# Altium footprint library PCBLIB.PcbLib: 557 footprints (part 3 of 36)
Each footprint in its own frame and in the unit in brackets; x right, y up, seen from the top. Pads: shape width x height; smd on the part's side, far side on the other; paste and mask are expansions set on the pad; w line width, h text height; cw(c..) or ccw(c..) is an arc to the next point about the centre after c.
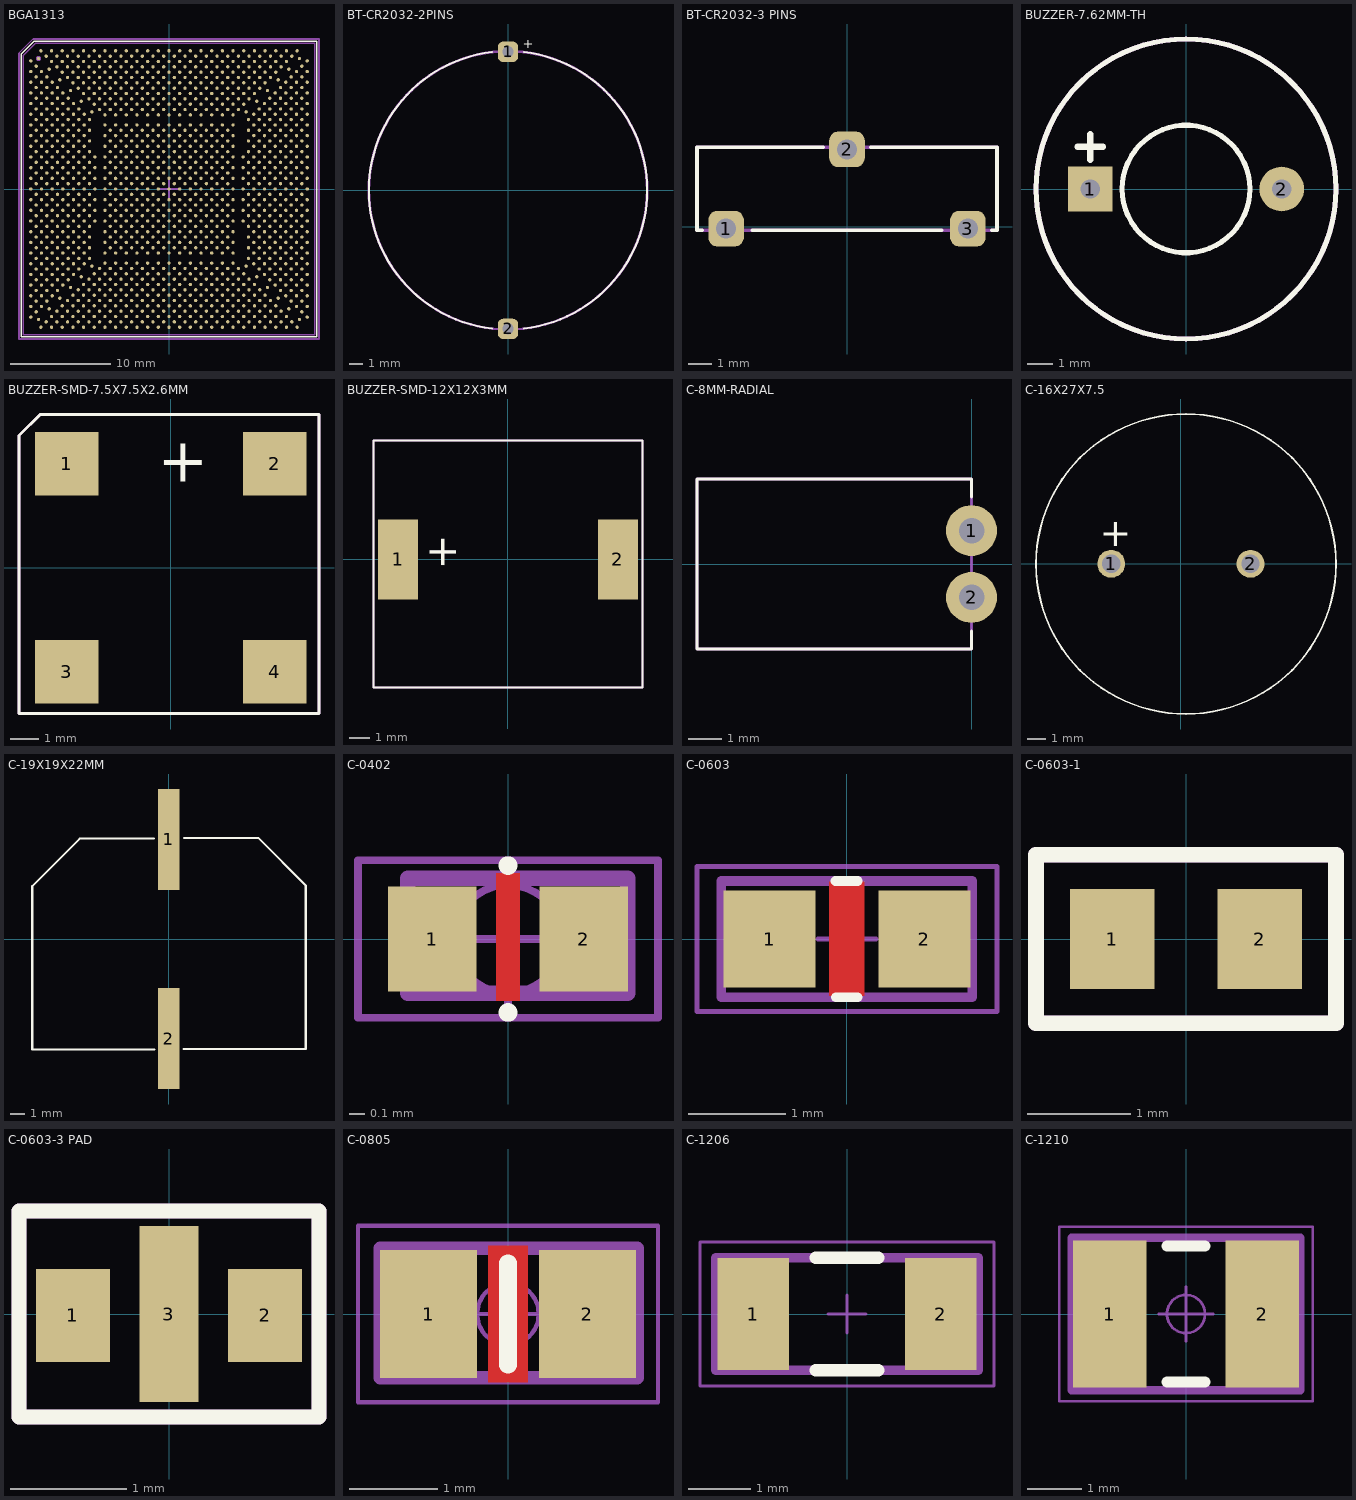
[diagram p2: the footprints below, top view; thin cyan lines are the x and y axes]

## BGA1313 [mil] "0.75 mm pitch, 29 mm x 29 mm x 2.37 mm"
pads (1313):
  round 13 smd: A3(-501.1,540.47) A5(-459.34,540.47) A7(-417.58,540.47) A9(-375.82,540.47) A11(-334.07,540.47) A13(-292.31,540.47) A15(-250.55,540.47) A17(-208.79,540.47) A19(-167.03,540.47) A21(-125.28,540.47) A23(-83.52,540.47) A25(-41.76,540.47) A27(0,540.47) A29(41.76,540.47) A31(83.52,540.47) A33(125.28,540.47) A35(167.03,540.47) A37(208.79,540.47) A39(250.55,540.47) A41(292.31,540.47) A43(334.07,540.47) A45(375.82,540.47) A47(417.58,540.47) A49(459.34,540.47) A51(501.1,540.47) AA1(-540.47,125.28) AA3(-498.71,125.28) AA5(-456.95,125.28) AA7(-415.19,125.28) AA9(-373.44,125.28) AA11(-331.68,125.28) AA13(-289.92,125.28) AA15(-250.55,125.28) AA17(-208.79,125.28) AA19(-167.03,125.28) AA21(-125.28,125.28) AA23(-83.52,125.28) AA25(-41.76,125.28) AA27(0,125.28) AA29(41.76,125.28) AA31(83.52,125.28) AA33(125.28,125.28) AA35(167.03,125.28) AA37(208.79,125.28) AA39(250.55,125.28) AA41(289.92,125.28) AA43(331.68,125.28) AA45(373.44,125.28) AA47(415.19,125.28) AA49(456.95,125.28) AA51(498.71,125.28) AA53(540.47,125.28) AB2(-519.59,104.39) AB4(-477.83,104.39) AB6(-436.07,104.39) AB8(-394.31,104.39) AB10(-352.56,104.39) AB12(-310.8,104.39) AB16(-229.67,104.39) AB18(-187.91,104.39) AB20(-146.15,104.39) AB22(-104.39,104.39) AB24(-62.64,104.39) AB26(-20.88,104.39) AB28(20.88,104.39) AB30(62.64,104.39) AB32(104.39,104.39) AB34(146.15,104.39) AB36(187.91,104.39) AB38(229.67,104.39) AB42(310.8,104.39) AB44(352.56,104.39) AB46(394.31,104.39) AB48(436.07,104.39) AB50(477.83,104.39) AB52(519.59,104.39) AC1(-540.47,83.52) AC3(-498.71,83.52) AC5(-456.95,83.52) AC7(-415.19,83.52) AC9(-373.44,83.52) AC11(-331.68,83.52) AC13(-289.92,83.52) AC15(-250.55,83.52) AC17(-208.79,83.52) AC19(-167.03,83.52) AC21(-125.28,83.52) AC23(-83.52,83.52) AC25(-41.76,83.52) AC27(0,83.52) AC29(41.76,83.52) AC31(83.52,83.52) AC33(125.28,83.52) AC35(167.03,83.52) AC37(208.79,83.52) AC39(250.55,83.52) AC41(289.92,83.52) AC43(331.68,83.52) AC45(373.44,83.52) AC47(415.19,83.52) AC49(456.95,83.52) AC51(498.71,83.52) AC53(540.47,83.52) AD2(-519.59,62.64) AD4(-477.83,62.64) AD6(-436.07,62.64) AD8(-394.31,62.64) AD10(-352.56,62.64) AD12(-310.8,62.64) AD16(-229.67,62.64) AD18(-187.91,62.64) AD20(-146.15,62.64) AD22(-104.39,62.64) AD24(-62.64,62.64) AD26(-20.88,62.64) AD28(20.88,62.64) AD30(62.64,62.64) AD32(104.39,62.64) AD34(146.15,62.64) AD36(187.91,62.64) AD38(229.67,62.64) AD42(310.8,62.64) AD44(352.56,62.64) AD46(394.31,62.64) AD48(436.07,62.64) AD50(477.83,62.64) AD52(519.59,62.64) AE1(-540.47,41.76) AE3(-498.71,41.76) AE5(-456.95,41.76) AE7(-415.19,41.76) AE9(-373.44,41.76) AE11(-331.68,41.76) AE13(-289.92,41.76) AE15(-250.55,41.76) AE17(-208.79,41.76) AE19(-167.03,41.76) AE21(-125.28,41.76) AE23(-83.52,41.76) AE25(-41.76,41.76) AE27(0,41.76) AE29(41.76,41.76) AE31(83.52,41.76) AE33(125.28,41.76) AE35(167.03,41.76) AE37(208.79,41.76) AE39(250.55,41.76) AE41(289.92,41.76) AE43(331.68,41.76) AE45(373.44,41.76) AE47(415.19,41.76) AE49(456.95,41.76) AE51(498.71,41.76) AE53(540.47,41.76) AF2(-519.59,20.88) AF4(-477.83,20.88) AF6(-436.07,20.88) AF8(-394.31,20.88) AF10(-352.56,20.88) AF12(-310.8,20.88) AF16(-229.67,20.88) AF18(-187.91,20.88) AF20(-146.15,20.88) AF22(-104.39,20.88) AF24(-62.64,20.88) AF26(-20.88,20.88) AF28(20.88,20.88) AF30(62.64,20.88) AF32(104.39,20.88) AF34(146.15,20.88) AF36(187.91,20.88) AF38(229.67,20.88) AF42(310.8,20.88) AF44(352.56,20.88) AF46(394.31,20.88) AF48(436.07,20.88) AF50(477.83,20.88) AF52(519.59,20.88) AG1(-540.47,0) AG3(-498.71,0) AG5(-456.95,0) AG7(-415.19,0) AG9(-373.44,0) AG11(-331.68,0) AG13(-289.92,0) AG15(-250.55,0) AG17(-208.79,0) AG19(-167.03,0) AG21(-125.28,0) AG23(-83.52,0) AG25(-41.76,0) AG27(0,0) AG29(41.76,0) AG31(83.52,0) AG33(125.28,0) AG35(167.03,0) AG37(208.79,0) AG39(250.55,0) AG41(289.92,0) AG43(331.68,0) AG45(373.44,0) AG47(415.19,0) AG49(456.95,0) AG51(498.71,0) AG53(540.47,0) AH2(-519.59,-20.88) AH4(-477.83,-20.88) AH6(-436.07,-20.88) AH8(-394.31,-20.88) AH10(-352.56,-20.88) AH12(-310.8,-20.88) AH16(-229.67,-20.88) AH18(-187.91,-20.88) AH20(-146.15,-20.88) AH22(-104.39,-20.88) AH24(-62.64,-20.88) AH26(-20.88,-20.88) AH28(20.88,-20.88) AH30(62.64,-20.88) AH32(104.39,-20.88) AH34(146.15,-20.88) AH36(187.91,-20.88) AH38(229.67,-20.88) AH42(310.8,-20.88) AH44(352.56,-20.88) AH46(394.31,-20.88) AH48(436.07,-20.88) AH50(477.83,-20.88) AH52(519.59,-20.88) AJ1(-540.47,-41.76) AJ3(-498.71,-41.76) AJ5(-456.95,-41.76) AJ7(-415.19,-41.76) AJ9(-373.44,-41.76) AJ11(-331.68,-41.76) AJ13(-289.92,-41.76) AJ15(-250.55,-41.76) AJ17(-208.79,-41.76) AJ19(-167.03,-41.76) AJ21(-125.28,-41.76) AJ23(-83.52,-41.76) AJ25(-41.76,-41.76) AJ27(0,-41.76) AJ29(41.76,-41.76) AJ31(83.52,-41.76) AJ33(125.28,-41.76) AJ35(167.03,-41.76) AJ37(208.79,-41.76) AJ39(250.55,-41.76) AJ41(289.92,-41.76) AJ43(331.68,-41.76) AJ45(373.44,-41.76) AJ47(415.19,-41.76) AJ49(456.95,-41.76) AJ51(498.71,-41.76) AJ53(540.47,-41.76) AK2(-519.59,-62.64) AK4(-477.83,-62.64) AK6(-436.07,-62.64) AK8(-394.31,-62.64) AK10(-352.56,-62.64) AK12(-310.8,-62.64) AK16(-229.67,-62.64) AK18(-187.91,-62.64) AK20(-146.15,-62.64) AK22(-104.39,-62.64) AK24(-62.64,-62.64) AK26(-20.88,-62.64) AK28(20.88,-62.64) AK30(62.64,-62.64) AK32(104.39,-62.64) AK34(146.15,-62.64) AK36(187.91,-62.64) AK38(229.67,-62.64) AK42(310.8,-62.64) AK44(352.56,-62.64) AK46(394.31,-62.64) AK48(436.07,-62.64) AK50(477.83,-62.64) AK52(519.59,-62.64) AL1(-540.47,-83.52) AL3(-498.71,-83.52) AL5(-456.95,-83.52) AL7(-415.19,-83.52) AL9(-373.44,-83.52) AL11(-331.68,-83.52) AL13(-289.92,-83.52) AL15(-250.55,-83.52) AL17(-208.79,-83.52) AL19(-167.03,-83.52) AL21(-125.28,-83.52) AL23(-83.52,-83.52) AL25(-41.76,-83.52) AL27(0,-83.52) AL29(41.76,-83.52) AL31(83.52,-83.52) AL33(125.28,-83.52) AL35(167.03,-83.52) AL37(208.79,-83.52) AL39(250.55,-83.52) AL41(289.92,-83.52) AL43(331.68,-83.52) AL45(373.44,-83.52) AL47(415.19,-83.52) AL49(456.95,-83.52) AL51(498.71,-83.52) AL53(540.47,-83.52) AM2(-519.59,-104.39) AM4(-477.83,-104.39) AM6(-436.07,-104.39) AM8(-394.31,-104.39) AM10(-352.56,-104.39) AM12(-310.8,-104.39) AM16(-229.67,-104.39) AM18(-187.91,-104.39) AM20(-146.15,-104.39) AM22(-104.39,-104.39) AM24(-62.64,-104.39) AM26(-20.88,-104.39) AM28(20.88,-104.39) AM30(62.64,-104.39) AM32(104.39,-104.39) AM34(146.15,-104.39) AM36(187.91,-104.39) AM38(229.67,-104.39) AM42(310.8,-104.39) AM44(352.56,-104.39) AM46(394.31,-104.39) AM48(436.07,-104.39) AM50(477.83,-104.39) AM52(519.59,-104.39) AN1(-540.47,-125.28) AN3(-498.71,-125.28) AN5(-456.95,-125.28) AN7(-415.19,-125.28) AN9(-373.44,-125.28) AN11(-331.68,-125.28) AN13(-289.92,-125.28) AN15(-250.55,-125.28) AN17(-208.79,-125.28) AN19(-167.03,-125.28) AN21(-125.28,-125.28) AN23(-83.52,-125.28) AN25(-41.76,-125.28) AN27(0,-125.28) AN29(41.76,-125.28) AN31(83.52,-125.28) AN33(125.28,-125.28) AN35(167.03,-125.28) AN37(208.79,-125.28) AN39(250.55,-125.28) AN41(289.92,-125.28) AN43(331.68,-125.28) AN45(373.44,-125.28) AN47(415.19,-125.28) AN49(456.95,-125.28) AN51(498.71,-125.28) AN53(540.47,-125.28) AP2(-519.59,-146.15) AP4(-477.83,-146.15) AP6(-436.07,-146.15) AP8(-394.31,-146.15) AP10(-352.56,-146.15) AP12(-310.8,-146.15) AP16(-229.67,-146.15) AP18(-187.91,-146.15) AP20(-146.15,-146.15) AP22(-104.39,-146.15) AP24(-62.64,-146.15) AP26(-20.88,-146.15) AP28(20.88,-146.15) AP30(62.64,-146.15) AP32(104.39,-146.15) AP34(146.15,-146.15) AP36(187.91,-146.15) AP38(229.67,-146.15) AP42(310.8,-146.15) AP44(352.56,-146.15) AP46(394.31,-146.15) AP48(436.07,-146.15) AP50(477.83,-146.15) AP52(519.59,-146.15) AR1(-540.47,-167.03) AR3(-498.71,-167.03) AR5(-456.95,-167.03) AR7(-415.19,-167.03) AR9(-373.44,-167.03) AR11(-331.68,-167.03) AR15(-250.55,-167.03) AR17(-208.79,-167.03) AR19(-167.03,-167.03) AR21(-125.28,-167.03) AR23(-83.52,-167.03) AR25(-41.76,-167.03) AR27(0,-167.03) AR29(41.76,-167.03) AR31(83.52,-167.03) AR33(125.28,-167.03) AR35(167.03,-167.03) AR37(208.79,-167.03) AR39(250.55,-167.03) AR43(331.68,-167.03) AR45(373.44,-167.03) AR47(415.19,-167.03) AR49(456.95,-167.03) AR51(498.71,-167.03) AR53(540.47,-167.03) AT2(-519.59,-187.91) AT4(-477.83,-187.91) AT6(-436.07,-187.91) AT8(-394.31,-187.91) AT10(-352.56,-187.91) AT12(-310.8,-187.91) AT16(-229.67,-187.91) AT18(-187.91,-187.91) AT20(-146.15,-187.91) AT22(-104.39,-187.91) AT24(-62.64,-187.91) AT26(-20.88,-187.91) AT28(20.88,-187.91) AT30(62.64,-187.91) AT32(104.39,-187.91) AT34(146.15,-187.91) AT36(187.91,-187.91) AT38(229.67,-187.91) AT42(310.8,-187.91) AT44(352.56,-187.91) AT46(394.31,-187.91) AT48(436.07,-187.91) AT50(477.83,-187.91) AT52(519.59,-187.91) AU1(-540.47,-208.79) AU3(-498.71,-208.79) AU5(-456.95,-208.79) AU7(-415.19,-208.79) AU9(-373.44,-208.79) AU11(-331.68,-208.79) AU15(-250.55,-208.79) AU17(-208.79,-208.79) AU19(-167.03,-208.79) AU21(-125.28,-208.79) AU23(-83.52,-208.79) AU25(-41.76,-208.79) AU27(0,-208.79) AU29(41.76,-208.79) AU31(83.52,-208.79) AU33(125.28,-208.79) AU35(167.03,-208.79) AU37(208.79,-208.79) AU39(250.55,-208.79) AU43(331.68,-208.79) AU45(373.44,-208.79) AU47(415.19,-208.79) AU49(456.95,-208.79) AU51(498.71,-208.79) AU53(540.47,-208.79) AV2(-519.59,-229.67) AV4(-477.83,-229.67) AV6(-436.07,-229.67) AV8(-394.31,-229.67) AV10(-352.56,-229.67) AV12(-310.8,-229.67) AV16(-229.67,-229.67) AV18(-187.91,-229.67) AV20(-146.15,-229.67) AV22(-104.39,-229.67) AV24(-62.64,-229.67) AV26(-20.88,-229.67) AV28(20.88,-229.67) AV30(62.64,-229.67) AV32(104.39,-229.67) AV34(146.15,-229.67) AV36(187.91,-229.67) AV38(229.67,-229.67) AV42(310.8,-229.67) AV44(352.56,-229.67) AV46(394.31,-229.67) AV48(436.07,-229.67) AV50(477.83,-229.67) AV52(519.59,-229.67) AW1(-540.47,-250.55) AW3(-498.71,-250.55) AW5(-456.95,-250.55) AW7(-415.19,-250.55) AW9(-373.44,-250.55) AW11(-331.68,-250.55) AW15(-250.55,-250.55) AW17(-208.79,-250.55) AW19(-167.03,-250.55) AW21(-125.28,-250.55) AW23(-83.52,-250.55) AW25(-41.76,-250.55) AW27(0,-250.55) AW29(41.76,-250.55) AW31(83.52,-250.55) AW33(125.28,-250.55) AW35(167.03,-250.55) AW37(208.79,-250.55) AW39(250.55,-250.55) AW43(331.68,-250.55) AW45(373.44,-250.55) AW47(415.19,-250.55) AW49(456.95,-250.55) AW51(498.71,-250.55) AW53(540.47,-250.55) AY2(-519.59,-271.43) AY4(-477.83,-271.43) AY6(-436.07,-271.43) AY8(-394.31,-271.43) AY10(-352.56,-271.43) AY12(-310.8,-271.43) AY42(310.8,-271.43) AY44(352.56,-271.43) AY46(394.31,-271.43) AY48(436.07,-271.43) AY50(477.83,-271.43) AY52(519.59,-271.43) B4(-480.22,519.59) B6(-438.46,519.59) B8(-396.7,519.59) B10(-354.94,519.59) B12(-313.19,519.59) B14(-271.43,519.59) B16(-229.67,519.59) B18(-187.91,519.59) B20(-146.15,519.59) B22(-104.39,519.59) B24(-62.64,519.59) B26(-20.88,519.59) B28(20.88,519.59) B30(62.64,519.59) B32(104.39,519.59) B34(146.15,519.59) B36(187.91,519.59) B38(229.67,519.59) B40(271.43,519.59) B42(313.19,519.59) B44(354.94,519.59) B46(396.7,519.59) B48(438.46,519.59) B50(480.22,519.59) BA1(-540.47,-292.31) BA3(-498.71,-292.31) BA5(-456.95,-292.31) BA7(-415.19,-292.31) BA9(-373.44,-292.31) BA11(-331.68,-292.31) BA13(-301.55,-301.55) BA15(-250.55,-289.92) BA17(-208.79,-289.92) BA19(-167.03,-289.92) BA21(-125.28,-289.92) BA23(-83.52,-289.92) BA25(-41.76,-289.92) BA27(0,-289.92) BA29(41.76,-289.92) BA31(83.52,-289.92) BA33(125.28,-289.92) BA35(167.03,-289.92) BA37(208.79,-289.92) BA39(250.55,-289.92) BA41(301.55,-301.55) BA43(331.68,-292.31) BA45(373.44,-292.31) BA47(415.19,-292.31) BA49(456.95,-292.31) BA51(498.71,-292.31) BA53(540.47,-292.31) BB2(-519.59,-313.19) BB4(-477.83,-313.19) BB6(-436.07,-313.19) BB8(-394.31,-313.19) BB10(-352.56,-313.19) BB14(-271.43,-310.8) BB16(-229.67,-310.8) BB18(-187.91,-310.8) BB20(-146.15,-310.8) BB22(-104.39,-310.8) BB24(-62.64,-310.8) BB26(-20.88,-310.8) BB28(20.88,-310.8) BB30(62.64,-310.8) BB32(104.39,-310.8) BB34(146.15,-310.8) BB36(187.91,-310.8) BB38(229.67,-310.8) BB40(271.43,-310.8) BB44(352.56,-313.19) BB46(394.31,-313.19) BB48(436.07,-313.19) BB50(477.83,-313.19) BB52(519.59,-313.19) BC1(-540.47,-334.07) BC3(-498.71,-334.07) BC5(-456.95,-334.07) BC7(-415.19,-334.07) BC9(-373.44,-334.07) BC11(-343.31,-343.31) BC13(-292.31,-331.68) BC15(-250.55,-331.68) BC17(-208.79,-331.68) BC19(-167.03,-331.68) BC21(-125.28,-331.68) BC23(-83.52,-331.68) BC25(-41.76,-331.68) BC27(0,-331.68) BC29(41.76,-331.68) BC31(83.52,-331.68) BC33(125.28,-331.68) BC35(167.03,-331.68) BC37(208.79,-331.68) BC39(250.55,-331.68) BC41(292.31,-331.68) BC43(343.31,-343.31) BC45(373.44,-334.07) BC47(415.19,-334.07) BC49(456.95,-334.07) BC51(498.71,-334.07) BC53(540.47,-334.07) BD2(-519.59,-354.94) BD4(-477.83,-354.94) BD6(-436.07,-354.94) BD8(-394.31,-354.94) BD12(-313.19,-352.56) BD14(-271.43,-352.56) BD16(-229.67,-352.56) BD18(-187.91,-352.56) BD20(-146.15,-352.56) BD22(-104.39,-352.56) BD24(-62.64,-352.56) BD26(-20.88,-352.56) BD28(20.88,-352.56) BD30(62.64,-352.56) BD32(104.39,-352.56) BD34(146.15,-352.56) BD36(187.91,-352.56) BD38(229.67,-352.56) BD40(271.43,-352.56) BD42(313.19,-352.56) BD46(394.31,-354.94) BD48(436.07,-354.94) BD50(477.83,-354.94) BD52(519.59,-354.94) BE1(-540.47,-375.82) BE3(-498.71,-375.82) BE5(-456.95,-375.82) BE7(-415.19,-375.82) BE9(-385.07,-385.07) BE11(-334.07,-373.44) BE13(-292.31,-373.44) BE15(-250.55,-373.44) BE17(-208.79,-373.44) BE19(-167.03,-373.44) BE21(-125.28,-373.44) BE23(-83.52,-373.44) BE25(-41.76,-373.44) BE27(0,-373.44) BE29(41.76,-373.44) BE31(83.52,-373.44) BE33(125.28,-373.44) BE35(167.03,-373.44) BE37(208.79,-373.44) BE39(250.55,-373.44) BE41(292.31,-373.44) BE43(334.07,-373.44) BE45(385.07,-385.07) BE47(415.19,-375.82) BE49(456.95,-375.82) BE51(498.71,-375.82) BE53(540.47,-375.82) BF2(-519.59,-396.7) BF4(-477.83,-396.7) BF6(-436.07,-396.7) BF10(-354.94,-394.31) BF12(-313.19,-394.31) BF14(-271.43,-394.31) BF16(-229.67,-394.31) BF18(-187.91,-394.31) BF20(-146.15,-394.31) BF22(-104.39,-394.31) BF24(-62.64,-394.31) BF26(-20.88,-394.31) BF28(20.88,-394.31) BF30(62.64,-394.31) BF32(104.39,-394.31) BF34(146.15,-394.31) BF36(187.91,-394.31) BF38(229.67,-394.31) BF40(271.43,-394.31) BF42(313.19,-394.31) BF44(354.94,-394.31) BF48(436.07,-396.7) BF50(477.83,-396.7) BF52(519.59,-396.7) BG1(-540.47,-417.58) BG3(-498.71,-417.58) BG5(-456.95,-417.58) BG7(-426.83,-426.83) BG9(-375.82,-415.19) BG11(-334.07,-415.19) BG13(-292.31,-415.19) BG15(-250.55,-415.19) BG17(-208.79,-415.19) BG19(-167.03,-415.19) BG21(-125.28,-415.19) BG23(-83.52,-415.19) BG25(-41.76,-415.19) BG27(0,-415.19) BG29(41.76,-415.19) BG31(83.52,-415.19) BG33(125.28,-415.19) BG35(167.03,-415.19) BG37(208.79,-415.19) BG39(250.55,-415.19) BG41(292.31,-415.19) BG43(334.07,-415.19) BG45(375.82,-415.19) BG47(426.83,-426.83) BG49(456.95,-417.58) BG51(498.71,-417.58) BG53(540.47,-417.58) BH2(-519.59,-438.46) BH4(-477.83,-438.46) BH8(-396.7,-436.07) BH10(-354.94,-436.07) BH12(-313.19,-436.07) BH14(-271.43,-436.07) BH16(-229.67,-436.07) BH18(-187.91,-436.07) BH20(-146.15,-436.07) BH22(-104.39,-436.07) BH24(-62.64,-436.07) BH26(-20.88,-436.07) BH28(20.88,-436.07) BH30(62.64,-436.07) BH32(104.39,-436.07) BH34(146.15,-436.07) BH36(187.91,-436.07) BH38(229.67,-436.07) BH40(271.43,-436.07) BH42(313.19,-436.07) BH44(354.94,-436.07) BH46(396.7,-436.07) BH50(477.83,-438.46) BH52(519.59,-438.46) BJ1(-540.47,-459.34) BJ3(-498.71,-459.34) BJ5(-468.59,-468.59) BJ7(-417.58,-456.95) BJ9(-375.82,-456.95) BJ11(-334.07,-456.95) BJ13(-292.31,-456.95) BJ15(-250.55,-456.95) BJ17(-208.79,-456.95) BJ19(-167.03,-456.95) BJ21(-125.28,-456.95) BJ23(-83.52,-456.95) BJ25(-41.76,-456.95) BJ27(0,-456.95) BJ29(41.76,-456.95) BJ31(83.52,-456.95) BJ33(125.28,-456.95) BJ35(167.03,-456.95) BJ37(208.79,-456.95) BJ39(250.55,-456.95) BJ41(292.31,-456.95) BJ43(334.07,-456.95) BJ45(375.82,-456.95) BJ47(417.58,-456.95) BJ49(468.59,-468.59) BJ51(498.71,-459.34) BJ53(540.47,-459.34) BK2(-519.59,-480.22) BK6(-438.46,-477.83) BK8(-396.7,-477.83) BK10(-354.94,-477.83) BK12(-313.19,-477.83) BK14(-271.43,-477.83) BK16(-229.67,-477.83) BK18(-187.91,-477.83) BK20(-146.15,-477.83) BK22(-104.39,-477.83) BK24(-62.64,-477.83) BK26(-20.88,-477.83) BK28(20.88,-477.83) BK30(62.64,-477.83) BK32(104.39,-477.83) BK34(146.15,-477.83) BK36(187.91,-477.83) BK38(229.67,-477.83) BK40(271.43,-477.83) BK42(313.19,-477.83) BK44(354.94,-477.83) BK46(396.7,-477.83) BK48(438.46,-477.83) BK52(519.59,-480.22) BL1(-540.47,-501.1) BL3(-510.34,-510.34) BL5(-459.34,-498.71) BL7(-417.58,-498.71) BL9(-375.82,-498.71) BL11(-334.07,-498.71) BL13(-292.31,-498.71) BL15(-250.55,-498.71) BL17(-208.79,-498.71) BL19(-167.03,-498.71) BL21(-125.28,-498.71) BL23(-83.52,-498.71) BL25(-41.76,-498.71) BL27(0,-498.71) BL29(41.76,-498.71) BL31(83.52,-498.71) BL33(125.28,-498.71) BL35(167.03,-498.71) BL37(208.79,-498.71) BL39(250.55,-498.71) BL41(292.31,-498.71) BL43(334.07,-498.71) BL45(375.82,-498.71) BL47(417.58,-498.71) BL49(459.34,-498.71) BL51(510.34,-510.34) BL53(540.47,-501.1) BM4(-480.22,-519.59) BM6(-438.46,-519.59) BM8(-396.7,-519.59) BM10(-354.94,-519.59) BM12(-313.19,-519.59) BM14(-271.43,-519.59) BM16(-229.67,-519.59) BM18(-187.91,-519.59) BM20(-146.15,-519.59) BM22(-104.39,-519.59) BM24(-62.64,-519.59) BM26(-20.88,-519.59) BM28(20.88,-519.59) BM30(62.64,-519.59) BM32(104.39,-519.59) BM34(146.15,-519.59) BM36(187.91,-519.59) BM38(229.67,-519.59) BM40(271.43,-519.59) BM42(313.19,-519.59) BM44(354.94,-519.59) BM46(396.7,-519.59) BM48(438.46,-519.59) BM50(480.22,-519.59) BN3(-501.1,-540.47) BN5(-459.34,-540.47) BN7(-417.58,-540.47) BN9(-375.82,-540.47) BN11(-334.07,-540.47) BN13(-292.31,-540.47) BN15(-250.55,-540.47) BN17(-208.79,-540.47) BN19(-167.03,-540.47) BN21(-125.28,-540.47) BN23(-83.52,-540.47) BN25(-41.76,-540.47) BN27(0,-540.47) BN29(41.76,-540.47) BN31(83.52,-540.47) BN33(125.28,-540.47) BN35(167.03,-540.47) BN37(208.79,-540.47) BN39(250.55,-540.47) BN41(292.31,-540.47) BN43(334.07,-540.47) BN45(375.82,-540.47) BN47(417.58,-540.47) BN49(459.34,-540.47) BN51(501.1,-540.47) C1(-540.47,501.1) C3(-510.34,510.34) C5(-459.34,498.71) C7(-417.58,498.71) C9(-375.82,498.71) C11(-334.07,498.71) C13(-292.31,498.71) C15(-250.55,498.71) C17(-208.79,498.71) C19(-167.03,498.71) C21(-125.28,498.71) C23(-83.52,498.71) C25(-41.76,498.71) C27(0,498.71) C29(41.76,498.71) C31(83.52,498.71) C33(125.28,498.71) C35(167.03,498.71) C37(208.79,498.71) C39(250.55,498.71) C41(292.31,498.71) C43(334.07,498.71) C45(375.82,498.71) C47(417.58,498.71) C49(459.34,498.71) C51(510.34,510.34) C53(540.47,501.1) D2(-519.59,480.22) D6(-438.46,477.83) D8(-396.7,477.83) D10(-354.94,477.83) D12(-313.19,477.83) D14(-271.43,477.83) D16(-229.67,477.83) D18(-187.91,477.83) D20(-146.15,477.83) D22(-104.39,477.83) D24(-62.64,477.83) D26(-20.88,477.83) D28(20.88,477.83) D30(62.64,477.83) D32(104.39,477.83) D34(146.15,477.83) D36(187.91,477.83) D38(229.67,477.83) D40(271.43,477.83) D42(313.19,477.83) D44(354.94,477.83) D46(396.7,477.83) D48(438.46,477.83) D52(519.59,480.22) E1(-540.47,459.34) E3(-498.71,459.34) E5(-468.59,468.59) E7(-417.58,456.95) E9(-375.82,456.95) E11(-334.07,456.95) E13(-292.31,456.95) E15(-250.55,456.95) E17(-208.79,456.95) E19(-167.03,456.95) E21(-125.28,456.95) E23(-83.52,456.95) E25(-41.76,456.95) E27(0,456.95) E29(41.76,456.95) E31(83.52,456.95) E33(125.28,456.95) E35(167.03,456.95) E37(208.79,456.95) E39(250.55,456.95) E41(292.31,456.95) E43(334.07,456.95) E45(375.82,456.95) E47(417.58,456.95) E49(468.59,468.59) E51(498.71,459.34) E53(540.47,459.34) F2(-519.59,438.46) F4(-477.83,438.46) F8(-396.7,436.07) F10(-354.94,436.07) F12(-313.19,436.07) F14(-271.43,436.07) F16(-229.67,436.07) F18(-187.91,436.07) F20(-146.15,436.07) F22(-104.39,436.07) F24(-62.64,436.07) F26(-20.88,436.07) F28(20.88,436.07) F30(62.64,436.07) F32(104.39,436.07) F34(146.15,436.07) F36(187.91,436.07) F38(229.67,436.07) F40(271.43,436.07) F42(313.19,436.07) F44(354.94,436.07) F46(396.7,436.07) F50(477.83,438.46) F52(519.59,438.46) G1(-540.47,417.58) G3(-498.71,417.58) G5(-456.95,417.58) G7(-426.83,426.83) G9(-375.82,415.19) G11(-334.07,415.19) G13(-292.31,415.19) G15(-250.55,415.19) G17(-208.79,415.19) G19(-167.03,415.19) G21(-125.28,415.19) G23(-83.52,415.19) G25(-41.76,415.19) G27(0,415.19) G29(41.76,415.19) G31(83.52,415.19) G33(125.28,415.19) G35(167.03,415.19) G37(208.79,415.19) G39(250.55,415.19) G41(292.31,415.19) G43(334.07,415.19) G45(375.82,415.19) G47(426.83,426.83) G49(456.95,417.58) G51(498.71,417.58) G53(540.47,417.58) H2(-519.59,396.7) H4(-477.83,396.7) H6(-436.07,396.7) H10(-354.94,394.31) H12(-313.19,394.31) H14(-271.43,394.31) H16(-229.67,394.31) H18(-187.91,394.31) H20(-146.15,394.31) H22(-104.39,394.31) H24(-62.64,394.31) H26(-20.88,394.31) H28(20.88,394.31) H30(62.64,394.31) H32(104.39,394.31) H34(146.15,394.31) H36(187.91,394.31) H38(229.67,394.31) H40(271.43,394.31) H42(313.19,394.31) H44(354.94,394.31) H48(436.07,396.7) H50(477.83,396.7) H52(519.59,396.7) J1(-540.47,375.82) J3(-498.71,375.82) J5(-456.95,375.82) J7(-415.19,375.82) J9(-385.07,385.07) J11(-334.07,373.44) J13(-292.31,373.44) J15(-250.55,373.44) J17(-208.79,373.44) J19(-167.03,373.44) J21(-125.28,373.44) J23(-83.52,373.44) J25(-41.76,373.44) J27(0,373.44) J29(41.76,373.44) J31(83.52,373.44) J33(125.28,373.44) J35(167.03,373.44) J37(208.79,373.44) J39(250.55,373.44) J41(292.31,373.44) J43(334.07,373.44) J45(385.07,385.07) J47(415.19,375.82) J49(456.95,375.82) J51(498.71,375.82) J53(540.47,375.82) K2(-519.59,354.94) K4(-477.83,354.94) K6(-436.07,354.94) K8(-394.31,354.94) K12(-313.19,352.56) K14(-271.43,352.56) K16(-229.67,352.56) K18(-187.91,352.56) K20(-146.15,352.56) K22(-104.39,352.56) K24(-62.64,352.56) K26(-20.88,352.56) K28(20.88,352.56) K30(62.64,352.56) K32(104.39,352.56) K34(146.15,352.56) K36(187.91,352.56) K38(229.67,352.56) K40(271.43,352.56) K42(313.19,352.56) K46(394.31,354.94) K48(436.07,354.94) K50(477.83,354.94) K52(519.59,354.94) L1(-540.47,334.07) L3(-498.71,334.07) L5(-456.95,334.07) L7(-415.19,334.07) L9(-373.44,334.07) L11(-343.31,343.31) L13(-292.31,331.68) L15(-250.55,331.68) L17(-208.79,331.68) L19(-167.03,331.68) L21(-125.28,331.68) L23(-83.52,331.68) L25(-41.76,331.68) L27(0,331.68) L29(41.76,331.68) L31(83.52,331.68) L33(125.28,331.68) L35(167.03,331.68) L37(208.79,331.68) L39(250.55,331.68) L41(292.31,331.68) L43(343.31,343.31) L45(373.44,334.07) L47(415.19,334.07) L49(456.95,334.07) L51(498.71,334.07) L53(540.47,334.07) M2(-519.59,313.19) M4(-477.83,313.19) M6(-436.07,313.19) M8(-394.31,313.19) M10(-352.56,313.19) M14(-271.43,310.8) M16(-229.67,310.8) M18(-187.91,310.8) M20(-146.15,310.8) M22(-104.39,310.8) M24(-62.64,310.8) M26(-20.88,310.8) M28(20.88,310.8) M30(62.64,310.8) M32(104.39,310.8) M34(146.15,310.8) M36(187.91,310.8) M38(229.67,310.8) M40(271.43,310.8) M44(352.56,313.19) M46(394.31,313.19) M48(436.07,313.19) M50(477.83,313.19) M52(519.59,313.19) N1(-540.47,292.31) N3(-498.71,292.31) N5(-456.95,292.31) N7(-415.19,292.31) N9(-373.44,292.31) N11(-331.68,292.31) N13(-301.55,301.55) N15(-250.55,289.92) N17(-208.79,289.92) N19(-167.03,289.92) N21(-125.28,289.92) N23(-83.52,289.92) N25(-41.76,289.92) N27(0,289.92) N29(41.76,289.92) N31(83.52,289.92) N33(125.28,289.92) N35(167.03,289.92) N37(208.79,289.92) N39(250.55,289.92) N41(301.55,301.55) N43(331.68,292.31) N45(373.44,292.31) N47(415.19,292.31) N49(456.95,292.31) N51(498.71,292.31) N53(540.47,292.31) P2(-519.59,271.43) P4(-477.83,271.43) P6(-436.07,271.43) P8(-394.31,271.43) P10(-352.56,271.43) P12(-310.8,271.43) P42(310.8,271.43) P44(352.56,271.43) P46(394.31,271.43) P48(436.07,271.43) P50(477.83,271.43) P52(519.59,271.43) R1(-540.47,250.55) R3(-498.71,250.55) R5(-456.95,250.55) R7(-415.19,250.55) R9(-373.44,250.55) R11(-331.68,250.55) R15(-250.55,250.55) R17(-208.79,250.55) R19(-167.03,250.55) R21(-125.28,250.55) R23(-83.52,250.55) R25(-41.76,250.55) R27(0,250.55) R29(41.76,250.55) R31(83.52,250.55) R33(125.28,250.55) R35(167.03,250.55) R37(208.79,250.55) R39(250.55,250.55) R43(331.68,250.55) R45(373.44,250.55) R47(415.19,250.55) R49(456.95,250.55) R51(498.71,250.55) R53(540.47,250.55) T2(-519.59,229.67) T4(-477.83,229.67) T6(-436.07,229.67) T8(-394.31,229.67) T10(-352.56,229.67) T12(-310.8,229.67) T16(-229.67,229.67) T18(-187.91,229.67) T20(-146.15,229.67) T22(-104.39,229.67) T24(-62.64,229.67) T26(-20.88,229.67) T28(20.88,229.67) T30(62.64,229.67) T32(104.39,229.67) T34(146.15,229.67) T36(187.91,229.67) T38(229.67,229.67) T42(310.8,229.67) T44(352.56,229.67) T46(394.31,229.67) T48(436.07,229.67) T50(477.83,229.67) T52(519.59,229.67) U1(-540.47,208.79) U3(-498.71,208.79) U5(-456.95,208.79) U7(-415.19,208.79) U9(-373.44,208.79) U11(-331.68,208.79) U15(-250.55,208.79) U17(-208.79,208.79) U19(-167.03,208.79) U21(-125.28,208.79) U23(-83.52,208.79) U25(-41.76,208.79) U27(0,208.79) U29(41.76,208.79) U31(83.52,208.79) U33(125.28,208.79) U35(167.03,208.79) U37(208.79,208.79) U39(250.55,208.79) U43(331.68,208.79) U45(373.44,208.79) U47(415.19,208.79) U49(456.95,208.79) U51(498.71,208.79) U53(540.47,208.79) V2(-519.59,187.91) V4(-477.83,187.91) V6(-436.07,187.91) V8(-394.31,187.91) V10(-352.56,187.91) V12(-310.8,187.91) V16(-229.67,187.91) V18(-187.91,187.91) V20(-146.15,187.91) V22(-104.39,187.91) V24(-62.64,187.91) V26(-20.88,187.91) V28(20.88,187.91) V30(62.64,187.91) V32(104.39,187.91) V34(146.15,187.91) V36(187.91,187.91) V38(229.67,187.91) V42(310.8,187.91) V44(352.56,187.91) V46(394.31,187.91) V48(436.07,187.91) V50(477.83,187.91) V52(519.59,187.91) W1(-540.47,167.03) W3(-498.71,167.03) W5(-456.95,167.03) W7(-415.19,167.03) W9(-373.44,167.03) W11(-331.68,167.03) W15(-250.55,167.03) W17(-208.79,167.03) W19(-167.03,167.03) W21(-125.28,167.03) W23(-83.52,167.03) W25(-41.76,167.03) W27(0,167.03) W29(41.76,167.03) W31(83.52,167.03) W33(125.28,167.03) W35(167.03,167.03) W37(208.79,167.03) W39(250.55,167.03) W43(331.68,167.03) W45(373.44,167.03) W47(415.19,167.03) W49(456.95,167.03) W51(498.71,167.03) W53(540.47,167.03) Y2(-519.59,146.15) Y4(-477.83,146.15) Y6(-436.07,146.15) Y8(-394.31,146.15) Y10(-352.56,146.15) Y12(-310.8,146.15) Y16(-229.67,146.15) Y18(-187.91,146.15) Y20(-146.15,146.15) Y22(-104.39,146.15) Y24(-62.64,146.15) Y26(-20.88,146.15) Y28(20.88,146.15) Y30(62.64,146.15) Y32(104.39,146.15) Y34(146.15,146.15) Y36(187.91,146.15) Y38(229.67,146.15) Y42(310.8,146.15) Y44(352.56,146.15) Y46(394.31,146.15) Y48(436.07,146.15) Y50(477.83,146.15) Y52(519.59,146.15)
Top Overlay:
  lines w6: -577.87,-577.87 577.87,-577.87 577.87,577.87 -527.87,577.87 -577.87,527.87 -577.87,-577.87
Mechanical 15:
  lines w6: -586.61,-586.61 -586.61,531.5 -531.5,586.61 586.61,586.61 586.61,-586.61 -586.61,-586.61
  lines w7.87: -43.31,0 0,0 ; 0,-43.31 0,0 ; 0,43.31 0,0 ; 43.31,0 0,0
ASM Top:
  circle w11.81: c-510.34,510.34 r4.72
  lines w6: -570.87,-570.87 -570.87,520.87 -520.87,570.87 570.87,570.87 570.87,-570.87 -570.87,-570.87
  text ".designator" at 0.05,10.1 h59.06

## BT-CR2032-2PINS [mm]
pads (2):
  rrect50% 1.5x1.5 hole 0.85: 1(0,10.25) 2(0,-10.25)
Top Overlay:
  lines w0.15: -1.197,-10.226 cw(c0,0) -1.197,10.226 ; 1.197,-10.226 ccw(c0,0) 1.197,10.226
  text "+" at 1.1,10.5 h0.7
ASM Top:
  circle w0.2: c0,0 r10.296
  text ".designator" at -0.6,-0.1 h0.8
3D body "CircuitWorks-BATT CR2032.step": height 3.21, standoff 0.01, extent -10,-10 10,10

## BT-CR2032-3 PINS [mm]
pads (3):
  rrect50% 1.5x1.5 hole 0.85: 1(-5.1,-0.075) 2(0,3.27) 3(5.1,-0.075)
Top Overlay:
  lines w0.15: -6.1,-0.15 -6.325,-0.15 -6.325,3.35 -1,3.35 ; -4,-0.15 4,-0.15 ; 1,3.35 6.325,3.35 6.325,-0.15 6.1,-0.15
ASM Top:
  lines w0.15: -6.325,-0.15 6.325,-0.15 6.325,3.35 -6.325,3.35 -6.325,-0.15
  text ".designator" at -1.91,1.19 h0.8
3D body "User Library-CR2032-PEN3 - Li-MnO2 Battery EEMB.step": height 21.04, standoff -3.99, extent -10.025,-0.15 10.025,3.35

## BUZZER-7.62MM-TH [mil]
pads (2):
  rect 70x70 hole 30 mask+0: 1(-150,0)
  round 70 hole 30 mask+0: 2(150,0)
Top Overlay:
  circle w8: c0,0 r235
  circle w8: c0,0 r100
  lines w10: -170,66 -130,66 ; -150,46 -150,86
ASM Top:
  circle w8: c0,0 r235
  text ".designator" at -169,-76 h31.5
3D body "cem-1205c.stp": height 374.52, standoff -176.67, extent -235.22,-235.21 237.23,237.23

## BUZZER-SMD-7.5X7.5X2.6MM [mm]
pads (4):
  rect 2.2x2.2 smd: 1(-3.6,3.6) 2(3.6,3.6) 3(-3.6,-3.6) 4(3.6,-3.6)
Top Overlay:
  lines w0.102: -5.258,-5.055 -5.258,4.572 -4.521,5.309 5.131,5.309 5.131,-5.055 -4.216,-5.055 -5.258,-5.055
  text "+" at -0.457,2.972 h1.52
ASM Top:
  lines w0.102: -5.258,-5.055 -5.258,4.572 -4.521,5.309 5.131,5.309 5.131,-5.055 -4.216,-5.055 -5.258,-5.055
  text ".designator" at -3.556,-0.203 h0.8
3D body "ST-025BL-1.step": height 2.53, standoff 0.01, extent -3.75,-3.725 3.75,3.775

## BUZZER-SMD-12X12X3MM [mm]
pads (2):
  rect 2x4 smd: 1(-5.5,0) 2(5.5,0)
Top Overlay:
  lines w0.102: -6.731,-6.401 -6.731,5.944 6.731,5.944 6.731,-6.401 -6.731,-6.401
  text "+" at -2.591,-0.508 h1.52
ASM Top:
  lines w0.102: -6.731,-6.401 6.731,-6.401 6.731,5.944 -6.731,5.944 -6.731,-6.401
  text ".designator" at -1.346,-0.152 h0.8
3D body "CUI_CMT-1203-SMT.step": height 3.06, standoff 0.01, extent -6.203,-6.209 5.797,5.791

## C-8MM-RADIAL [mil]
pads (2):
  round 60 hole 30: 1(0,39.37) 2(0,-39.37)
Top Overlay:
  lines w4: 0,-79 0,-100 -323,-100 -323,100 0,100 0,79
ASM Top:
  lines w4: -323,-100 0,-100 0,100 -323,100 -323,-100
  text ".designator" at -299,-20 h31.5

## C-16X27X7.5 [mil]
pads (2):
  round 60 hole 39.37: 1(-150,0) 2(150,0)
Top Overlay:
  circle w4: c11,-0.45 r322.95
  text "+" at -175,38 h60
3D body "ESH158M035AM7AA.step": height 1102.67, standoff -748.14, extent -313.8,-325.25 335.8,325

## C-19X19X22MM [mm]
pads (2):
  rect 1.5x7 smd: 1(0,6.9) 2(0,-6.9)
Top Overlay:
  lines w0.152: -1.041,6.96 -6.172,6.96 -9.474,3.658 -9.474,-7.671 -0.991,-7.671 ; 1.016,-7.62 9.5,-7.62 9.5,3.708 6.198,7.01 1.067,7.01

## C-0402 [mm]
pads (2):
  rect 0.57x0.68 smd: 1(-0.49,0) 2(0.49,0)
Top Layer:
  pour cut-out: -0.075,0.425 -0.075,-0.4 0.075,-0.4 0.075,0.425
Top Overlay:
  circle w0.1: c0,-0.475 r0.01
  circle w0.1: c0,0.475 r0.01
Mechanical 15:
  circle w0.05: c0,0 r0.35
  lines w0.05: -0.5,0 0.5,0 ; 0,-0.5 0,0.5 ; -0.97,-0.51 -0.97,0.51 0.97,0.51 0.97,-0.51 -0.97,-0.51
ASM Top:
  lines w0.1: -0.648,-0.35 -0.648,0.393 0.775,0.393 0.775,-0.35 -0.648,-0.35
  text ".designator" at -0.299,-0.183 h0.8
3D body "CAPC1005X55N EIA 0402.step": height 0.51, standoff 0.01, extent -0.517,-0.264 0.483,0.286

## C-0603 [mm]
pads (2):
  rect 0.95x1 smd: 1(-0.8,0) 2(0.8,0)
Top Layer:
  pour cut-out: -0.184,0.591 -0.184,-0.586 0.177,-0.586 0.177,0.591
Top Overlay:
  lines w0.1: -0.118,0.6 0.112,0.6 ; -0.116,-0.6 0.112,-0.6
Mechanical 15:
  lines w0.05: -0.3,0 0.3,0 ; 0,-0.3 0,0.3 ; -1.55,-0.75 1.55,-0.75 1.55,0.75 -1.55,0.75 -1.55,-0.75
ASM Top:
  lines w0.1: -1.3,-0.6 -1.3,0.6 1.294,0.6 1.294,-0.6 -1.3,-0.6
  text ".designator" at -0.4,-0.3 h0.8
3D body "CAPC1508X65N EIA 0603.step": height 0.66, standoff 0.01, extent -0.756,-0.4 0.744,0.4

## C-0603-1 [mil]
pads (2):
  rect 32x38 smd mask+0: 1(-28,0) 2(28,0)
Top Overlay:
  lines w6: -57,-32 -57,32 57,32 57,-32 -57,-32
ASM Top:
  lines w6: -57,-32 -57,32 57,32 57,-32 -57,-32
  text ".designator" at -40,-15 h31.5
3D body "CAPC1508X65N EIA 0603.step": height 26.09, standoff 0.5, extent -29.53,-15.75 29.53,15.75

## C-0603-3 PAD [mm]
height 0.66
pads (3):
  rect 0.64x0.8 smd mask+0.051: 1(-0.83,-0.013) 2(0.83,-0.013)
  rect 0.51x1.52 smd paste+0 mask+0.051: 3(0,0)
Top Overlay:
  lines w0.127: -1.295,-0.889 -1.295,0.889 1.295,0.889 1.295,-0.889 -1.295,-0.889
ASM Top:
  lines w0.127: -1.295,-0.889 -1.295,0.889 1.295,0.889 1.295,-0.889 -1.295,-0.889
  text ".designator" at -0.229,-0.152 h0.8
3D body "X14.step": height 0.66, standoff 0, extent -0.876,-0.508 0.876,0.508

## C-0805 [mm]
pads (2):
  rect 1.1x1.45 smd: 1(-0.9,0) 2(0.9,0)
Top Layer:
  pour cut-out: -0.225,0.775 -0.225,-0.775 0.225,-0.775 0.225,0.775
Top Overlay:
  lines w0.2: 0,-0.575 0,0.575
Mechanical 15:
  circle w0.05: c0,0 r0.35
  lines w0.05: -0.5,0 0.5,0 ; 0,-0.5 0,0.5 ; -1.7,-1 1.7,-1 1.7,1 -1.7,1 -1.7,-1
ASM Top:
  lines w0.152: -1.449,-0.722 -1.449,0.744 1.467,0.744 1.467,-0.722 -1.449,-0.722
  text ".designator" at -0.642,-0.344 h0.8
3D body "CAPC2012X94N EIA 0805.step": height 0.95, standoff 0.01, extent -1,-0.6 1,0.6

## C-1206 [mm]
pads (2):
  rect 1.15x1.8 smd: 1(-1.5,0) 2(1.5,0)
Top Overlay:
  lines w0.2: -0.5,-0.9 0.5,-0.9 ; -0.5,0.9 0.5,0.9
Mechanical 15:
  lines w0.05: -0.3,0 0.3,0 ; 0,-0.3 0,0.3 ; -2.35,-1.15 -2.35,1.15 2.35,1.15 2.35,-1.15 -2.35,-1.15
ASM Top:
  lines w0.152: -2.1,-0.9 -2.1,0.9 2.1,0.9 2.1,-0.9 -2.1,-0.9
  text ".designator" at -0.7,-0.3 h0.8
3D body "CAPC3215X168N EIA 1206.step": height 1.51, standoff 0.01, extent -1.6,-0.842 1.6,0.838

## C-1210 [mm]
pads (2):
  rect 1.35x2.7 smd: 1(-1.4,0) 2(1.4,0)
Top Overlay:
  lines w0.2: -0.35,-1.25 0.35,-1.25 ; -0.35,1.25 0.35,1.25
Mechanical 15:
  circle w0.05: c0,0 r0.35
  lines w0.05: -0.5,0 0.5,0 ; 0,-0.5 0,0.5 ; -2.325,-1.6 2.325,-1.6 2.325,1.6 -2.325,1.6 -2.325,-1.6
ASM Top:
  lines w0.152: -2.1,-1.4 -2.1,1.4 2.1,1.4 2.1,-1.4 -2.1,-1.4
  text ".designator" at -0.8,-0.4 h0.8
3D body "CAPC3225X88N EIA 1210.step": height 0.89, standoff 0.01, extent -1.6,-1.255 1.6,1.245